# Altium footprint library PcbLib.PcbLib: 154 footprints (part 3 of 10)
Each footprint in its own frame and in the unit in brackets; x right, y up, seen from the top. Pads: shape width x height; smd on the part's side, far side on the other; paste and mask are expansions set on the pad; w line width, h text height; cw(c..) or ccw(c..) is an arc to the next point about the centre after c.
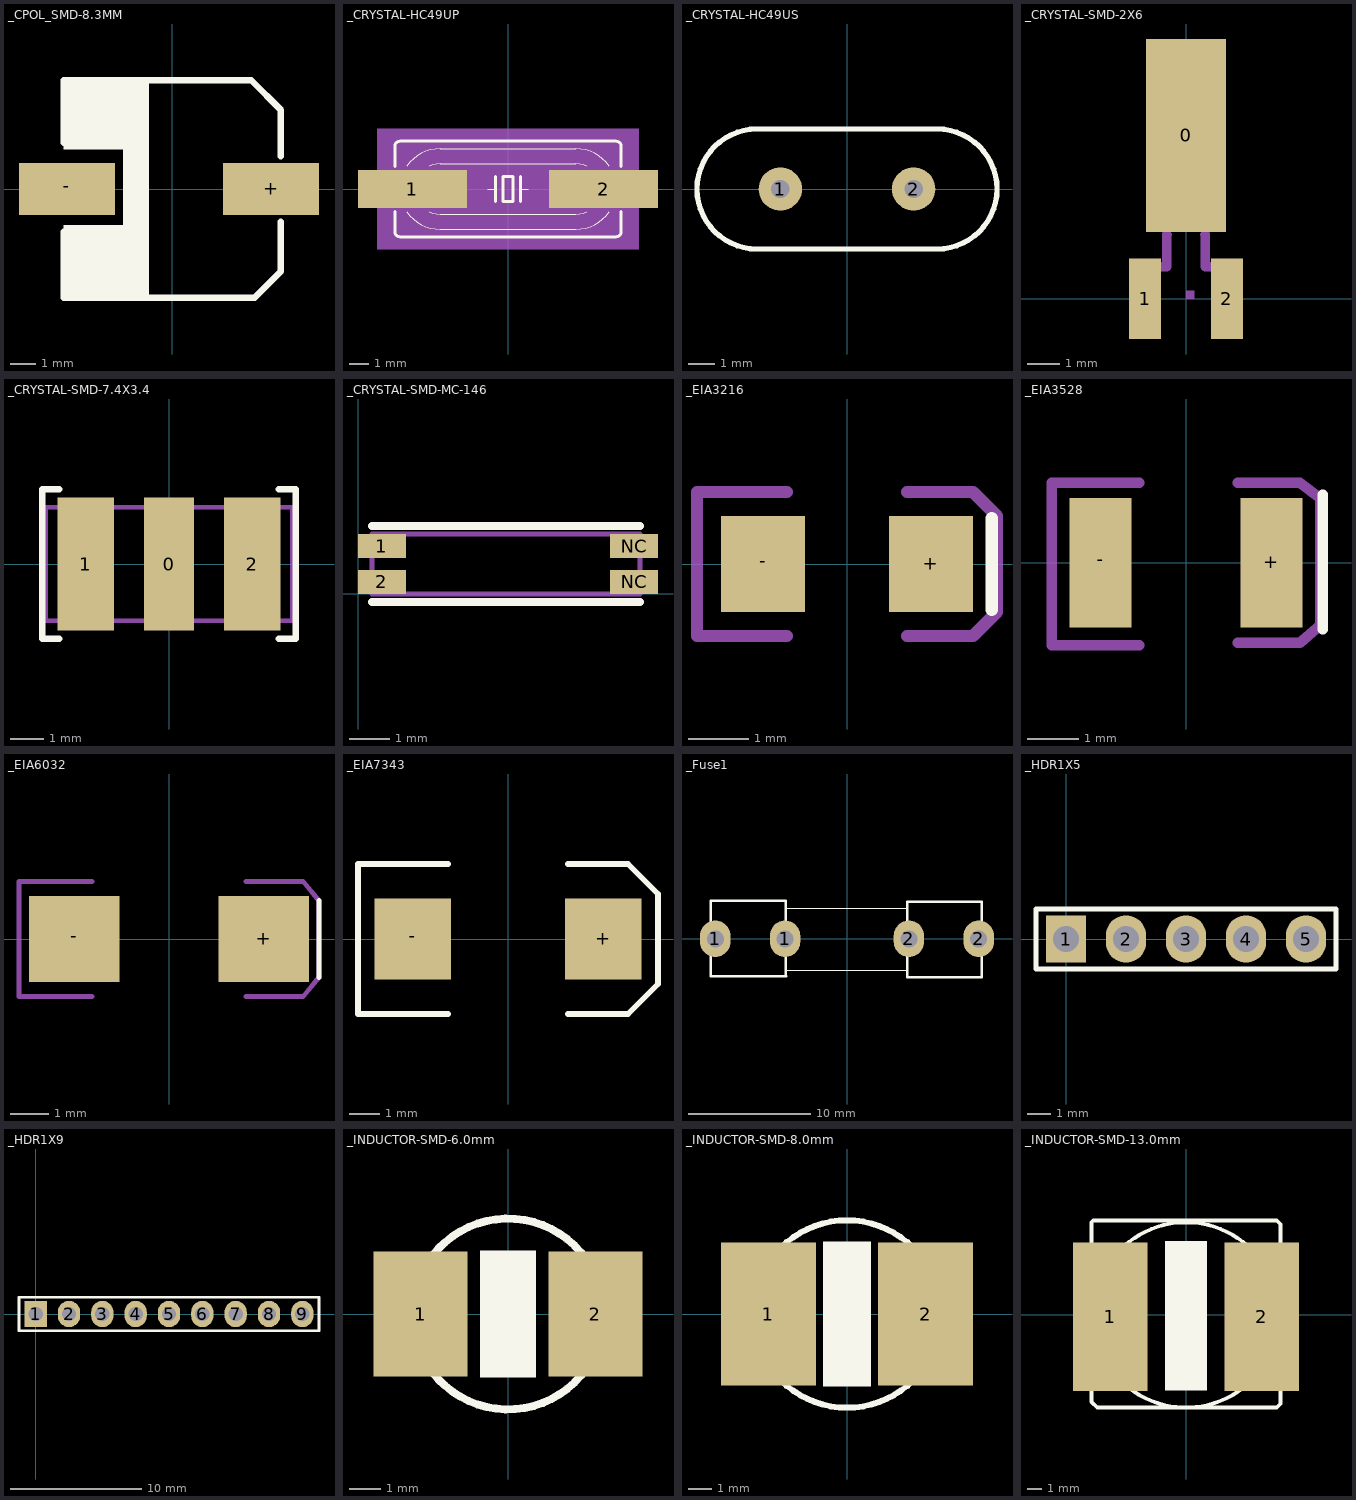
[diagram p2: the footprints below, top view; thin cyan lines are the x and y axes]

## _CPOL_SMD-8.3MM [mm]
pads (2):
  rect 3.7x2 smd: +(3.81,0) -(-4.064,0)
Top Overlay:
  rectangle: -4.191,1.524 -0.889,4.191
  rectangle: -1.905,-4.064 -0.889,1.524
  rectangle: -4.191,-4.191 -1.778,-1.397
  lines w0.25: -4.191,-1.651 -4.191,-4.191 3.175,-4.191 4.191,-3.175 4.191,-1.27 ; -4.191,1.778 -4.191,4.191 3.048,4.191 4.191,3.048 4.191,1.27

## _CRYSTAL-HC49UP [mil]
pads (2):
  rect 216.54x76 smd: 1(-190,0) 2(190,0)
Top Overlay:
  lines w2: -201.15,-45 ccw(c-135,0) -135,-80 135,-80 ccw(c135,0) 201.14,-45 ; -201.15,45 cw(c-135,-0.01) -135,80 135,80 cw(c135,0) 201.15,45 ; -156.8,-45 ccw(c-135,0.01) -135,-50 135,-50 ccw(c135,0.01) 156.8,-45 ; -156.8,45 cw(c-135,-0.01) -135,50 135,50 cw(c135,-0.01) 156.8,45 ; -40,0 -25,0 ; 25,0 40,0
  lines w6: -225,-45 -225,-85 ccw(c-215,-85) -215,-95 215,-95 ccw(c215,-85) 225,-85 225,-45 ; -225,45 -225,85 cw(c-215,85) -215,95 215,95 cw(c215,85) 225,85 225,45 ; -25,-25 -25,0 -25,25 ; 25,-25 25,0 25,25 ; -10,-25 -10,25 10,25 10,-25 -10,-25
Mechanical 10:
  rectangle: -260,-120 260,120
Mechanical 16:
  lines w2: -201.15,-45 cw(c-135,0) -201.15,45 ; -156.8,-45 cw(c-135,0) -156.8,45 ; 156.8,-45 ccw(c135,0) 156.8,45 ; 201.15,-45 ccw(c135,0) 201.15,45
  lines w6: -225,-45 -225,-15 ; -225,45 -225,15 ; 225,-45 225,45 ; 225,-15 255,-15 255,15 225,15 ; -225,-15 -225,15 ; -225,-15 -255,-15 -255,15 -225,15

## _CRYSTAL-HC49US [mil]
pads (2):
  round 65 hole 27.56: 1(-100,0) 2(100,0)
Top Overlay:
  lines w8: -135,-90 cw(c-135,0) -135,90 135,90 cw(c135,0) 135,-90 -135,-90

## _CRYSTAL-SMD-2X6 [mm]
pads (3):
  rect 2.5x6 smd: 0(0,5.08)
  rect 1x2.5 smd: 1(-1.27,0) 2(1.27,0)
Mechanical 16:
  region: 0,0 0.254,0 0.254,0.254 0,0.254
  lines w0.127: -0.6,2 -0.5,2 ; 0.5,2 0.6,2
  lines w0.3: -1.27,-1 -1.27,1 -0.6,1 -0.6,2 ; 0.6,2 0.6,1 1.27,1 1.27,-1

## _CRYSTAL-SMD-7.4X3.4 [mm]
pads (3):
  rect 1.5x4 smd: 0(0,0)
  rect 1.7x4 smd: 1(-2.5,0) 2(2.5,0)
Top Overlay:
  lines w0.203: -3.3,-2.245 -3.8,-2.245 -3.8,2.245 -3.3,2.245 ; 3.3,-2.245 3.8,-2.245 3.8,2.245 3.3,2.245
Mechanical 16:
  region: 0,0 0.254,0 0.254,0.254 0,0.254
  region: 0,0 0.254,0 0.254,0.254 0,0.254
  region: 0,0 0.254,0 0.254,0.254 0,0.254
  lines w0.127: -3.7,-1.7 3.7,-1.7 3.7,1.7 -3.7,1.7 -3.7,-1.7

## _CRYSTAL-SMD-MC-146 [mm]
pads (4):
  rect 1.2x0.6 smd: 1(0.6,1.2) 2(0.6,0.3) NC(6.9,0.3) NC(6.9,1.2)
Top Overlay:
  lines w0.203: 0.35,-0.2 7.05,-0.2 ; 0.35,1.7 7.05,1.7
Mechanical 16:
  lines w0.127: 0.35,0 0.35,1.5 7.05,1.5 7.05,0 0.35,0

## _EIA3216 [mm]
pads (2):
  rect 1.4x1.6 smd: +(1.4,0) -(-1.4,0)
Top Overlay:
  lines w0.203: 2.413,-0.762 2.413,0.762
Mechanical 16:
  lines w0.203: -1,-1.2 -2.5,-1.2 -2.5,1.2 -1,1.2 ; 1,-1.2 2.1,-1.2 2.5,-0.8 2.5,0.8 2.1,1.2 1,1.2

## _EIA3528 [mm]
pads (2):
  rect 1.2x2.5 smd: +(1.65,0) -(-1.65,0)
Top Overlay:
  lines w0.203: 2.641,-1.286 2.641,1.311
Mechanical 16:
  lines w0.203: -0.9,-1.6 -2.6,-1.6 -2.6,1.55 -0.9,1.55 ; 1,-1.55 2.2,-1.55 2.6,-1.2 2.6,1.25 2.2,1.55 1,1.55

## _EIA6032 [mm]
pads (2):
  rect 2.37x2.23 smd: +(2.47,0) -(-2.47,0)
Top Overlay:
  lines w0.127: 3.91,-1 3.91,1
Mechanical 16:
  lines w0.127: -2,-1.5 -3.91,-1.5 -3.91,1.5 -2,1.5 ; 2,-1.5 3.5,-1.5 3.91,-1 3.91,1 3.5,1.5 2,1.5

## _EIA7343 [mm]
pads (2):
  rect 2.55x2.7 smd: +(3.17,0) -(-3.17,0)
Top Overlay:
  lines w0.203: -2,-2.5 -5,-2.5 -5,2.5 -2,2.5 ; 2,-2.5 4,-2.5 5,-1.5 5,1.5 4,2.5 2,2.5

## _Fuse1 [mm]
pads (4):
  oval 2.5x3 hole 1.4: 1(-10.795,0) 1(-5.08,0) 2(5.08,0) 2(10.795,0)
Top Overlay:
  lines w0.1: -5.013,2.517 4.945,2.517 ; -5.005,-2.591 4.945,-2.591
  lines w0.2: -5.015,3.115 -5.005,0.005 -5.005,-3.075 ; -5.005,3.105 -11.176,3.105 -11.176,-3.085 -4.975,-3.085 ; 4.925,-3.135 11.049,-3.135 11.049,3.055 5.035,3.055 ; 4.945,-3.145 4.945,3.045

## _HDR1X5 [mm] "Connector; Header; 5 Position"
pads (5):
  rect 1.7x2 hole 1.1: 1(0,0)
  oval 1.7x2 hole 1.1: 2(2.54,0) 3(5.08,0) 4(7.62,0) 5(10.16,0)
Top Overlay:
  lines w0.2: -1.27,-1.27 11.43,-1.27 11.43,1.27 -1.27,1.27 -1.27,-1.27

## _HDR1X9 [mm] "Connector; Header; 9 Position"
pads (9):
  rect 1.7x2 hole 1.1: 1(0,0)
  oval 1.7x2 hole 1.1: 2(2.54,0) 3(5.08,0) 4(7.62,0) 5(10.16,0) 6(12.7,0) 7(15.24,0) 8(17.78,0) 9(20.32,0)
Top Overlay:
  lines w0.2: -1.27,-1.27 21.59,-1.27 21.59,1.27 -1.27,1.27 -1.27,-1.27

## _INDUCTOR-SMD-6.0mm [mm]
pads (2):
  rect 3x4 smd: 1(-2.794,0) 2(2.794,0)
Top Overlay:
  circle w0.254: c0,0 r3.051
  rectangle: -0.889,-2.032 0.889,2.032

## _INDUCTOR-SMD-8.0mm [mm]
pads (2):
  rect 4x6 smd: 1(-3.302,0) 2(3.302,0)
Top Overlay:
  circle w0.254: c0,0 r3.937
  rectangle: -1.016,-3.048 1.016,3.048

## _INDUCTOR-SMD-13.0mm [mm]
pads (2):
  rect 5x10 smd: 1(-5.08,-0.127) 2(5.08,-0.127)
Top Overlay:
  circle w0.254: c0,0 r6.224
  rectangle: -1.397,-5.08 1.397,4.953
  lines w0.25: -6.35,-5.842 -5.969,-6.223 6.096,-6.223 6.35,-5.969 6.35,6.096 6.096,6.35 -6.223,6.35 -6.35,6.223 -6.35,0.127 -6.35,-5.842